# Altium footprint library Miscellaneous SMD.PcbLib: 82 footprints (part 5 of 7) (continued)
## MINI-DIMM_DDR3-1.5V (MO-244) [mm] "Mini DIMM 244 Contacts (DDR3 1.5V Mechanical Keying) Board Edge Connector (JEDEC MO-244)" (continued)
Top Overlay:
  text "122" at 39.175,-0.825 h0.76
  text "1" at -38.55,-0.675 h0.76
Bottom Overlay:
  text "244" at 38.475,-0.925 h0.76
  text "123" at -39.3,-0.875 h0.76
Mechanical 8:
  circle w0.1: c39,4.475 r0.9
  circle w0.1: c-39,4.475 r0.9
  lines w0.1: -46,-1.525 -41,-1.525 -41,-6.525 ; -41.5,18.475 -41,18.475 ; -41,17.975 -41,18.475 ; -41,18.975 -41,18.475 ; -41,30.845 -41,20.475 cw(c-41,18.475) -41,16.475 -41,9.475 -40,9.475 cw(c-40,8.475) -40,7.475 -41,7.475 -41,-0.775 -40.25,-1.525 2.4,-1.525 2.4,1.775 ; -40.5,8.475 -40,8.475 ; -40.5,18.475 -41,18.475 ; -40,7.975 -40,8.475 ; -40,8.975 -40,8.475 ; -39.5,4.475 -39,4.475 ; -39.5,8.475 -40,8.475 ; -39,3.975 -39,4.475 ; -39,4.975 -39,4.475 ; -39,30.845 -39,20.711 cw(c-41,18.475) -38,18.475 -38,2.475 38,2.475 38,18.475 cw(c41,18.475) 39,20.711 39,30.845 ; -38.5,4.475 -39,4.475 ; -0.5,7.365 0,7.365 ; -0.354,-0.354 0,0 ; -0.354,0.354 0,0 ; -0.25,3.525 3.825,3.525 ; 0,6.865 0,7.365 ; 0,7.865 0,7.365 ; 0.35,3.275 0.6,3.525 0.35,3.775 ; 0.354,-0.354 0,0 ; 0.354,0.354 0,0 ; 0.5,7.365 0,7.365 ; 0.6,4 0.6,0 ; 2.9,1.275 2.9,1.775 ; 2.9,2.275 2.9,1.775 ; 2.9,4 2.9,1.775 ; 3.15,3.275 2.9,3.525 3.15,3.775 ; 38.5,4.475 39,4.475 ; 39,3.975 39,4.475 ; 39,4.975 39,4.475 ; 39.5,4.475 39,4.475 ; 39.5,8.475 40,8.475 ; 40,7.975 40,8.475 ; 40,8.975 40,8.475 ; 40.5,8.475 40,8.475 ; 40.5,18.475 41,18.475 ; 41,-6.525 41,-1.525 46,-1.525 ; 41,17.975 41,18.475 ; 41,18.975 41,18.475 ; 41,30.845 41,20.475 ccw(c41,18.475) 41,16.475 41,9.475 40,9.475 ccw(c40,8.475) 40,7.475 41,7.475 41,-0.775 40.25,-1.525 3.4,-1.525 3.4,1.775 ; 41.5,18.475 41,18.475 ; -38.025,1.275 -37.8,0 -37.575,1.275 ; -38.025,1.275 -37.575,1.275 ; -38.025,1.275 -38.025,-1.275 -37.575,-1.275 -37.575,1.275 ; 0.375,1.275 0.6,0 ; 0.375,1.275 0.825,1.275 ; 0.375,1.275 0.375,-1.275 0.825,-1.275 0.825,1.275 ; 0.6,0 0.825,1.275 ; 2.4,1.775 cw(c2.9,1.775) 3.4,1.775 ; 2.4,1.775 2.9,1.775 ; 2.9,1.775 3.4,1.775 ; 3.975,1.275 4.2,0 4.425,1.275 ; 3.975,1.275 4.425,1.275 ; 3.975,1.275 3.975,-1.275 4.425,-1.275 4.425,1.275 ; 37.575,1.275 37.8,0 38.025,1.275 ; 37.575,1.275 38.025,1.275 ; 37.575,1.275 37.575,-1.275 38.025,-1.275 38.025,1.275
  text "2.3mm" at -0.425,4.45 h1.2

## MITSUBISHI_FU-456RDF-9M2-A [mm] "1.3um Band Transmitter Optical Sub Assembly  (TOSA) Laser Module"
height 14.53
pads (8):
  round 1.1 hole 0.6: 1(-1.7,2.75) 8(-1.7,-2.75)
  rect 1.05x0.45 smd: 2(0,1.975) 3(0,1.185) 4(0,0.395) 5(0,-0.395) 6(0,-1.185) 7(0,-1.975)
Top Overlay:
  circle w0.2: c-13.75,0.2 r2.4
  circle w0.2: c-13.75,0.2 r1
  circle w0.2: c-13.75,0.2 r1.495
  lines w0.2: -12.915,-2.05 -5.45,-2.05 -4.05,-2.75 -2.6,-2.75 ; -12.915,2.45 -4.65,2.45 -4.05,2.75 -2.6,2.75 ; -0.8,-2.75 0.65,-2.75 0.65,-2.605 ; -0.8,2.75 0.65,2.75 0.65,2.605
  text "1" at -3.088,1.25 h1
Mechanical 8:
  lines w0.1: -14,0.2 -13.75,0.2 ; -13.75,-0.05 -13.75,0.2 ; -13.75,0.45 -13.75,0.2 ; -13.5,0.2 -13.75,0.2 ; -1.95,-2.75 -1.7,-2.75 ; -1.95,2.75 -1.7,2.75 ; -1.7,-3 -1.7,-2.75 ; -1.7,-2.5 -1.7,-2.75 ; -1.7,2.5 -1.7,2.75 ; -1.7,3 -1.7,2.75 ; -1.45,-2.75 -1.7,-2.75 ; -1.45,2.75 -1.7,2.75 ; -0.354,-0.354 0,0 ; -0.354,0.354 0,0 ; -0.25,-1.975 0,-1.975 ; -0.25,-1.185 0,-1.185 ; -0.25,-0.395 0,-0.395 ; -0.25,0.395 0,0.395 ; -0.25,1.185 0,1.185 ; -0.25,1.975 0,1.975 ; 0,-2.225 0,-1.975 ; 0,-1.725 0,-1.975 ; 0,-1.435 0,-1.185 ; 0,-0.935 0,-1.185 ; 0,-0.645 0,-0.395 ; 0,-0.145 0,-0.395 ; 0,0.145 0,0.395 ; 0,0.645 0,0.395 ; 0,0.935 0,1.185 ; 0,1.435 0,1.185 ; 0,1.725 0,1.975 ; 0,2.225 0,1.975 ; 0.25,-1.975 0,-1.975 ; 0.25,-1.185 0,-1.185 ; 0.25,-0.395 0,-0.395 ; 0.25,0.395 0,0.395 ; 0.25,1.185 0,1.185 ; 0.25,1.975 0,1.975 ; 0.354,-0.354 0,0 ; 0.354,0.354 0,0
Mechanical 14:
  circle w0.1: c-13.75,0.2 r2.4
  circle w0.1: c-13.75,0.2 r1
  circle w0.1: c-13.75,0.2 r1.495
  lines w0.1: -12.915,-2.05 -5.45,-2.05 -4.05,-2.75 -2,-2.75 cw(c-1.7,-2.75) -1.4,-2.75 0.65,-2.75 0.65,2.75 -1.4,2.75 cw(c-1.7,2.75) -2,2.75 -4.05,2.75 -4.65,2.45 -12.915,2.45 ; -2.2,-2.75 cw(c-1.7,-2.75) -1.2,-2.75 ; -2.2,2.75 ccw(c-1.7,2.75) -1.2,2.75 ; -0.5,-2.175 0.5,-2.175 0.5,-1.775 -0.5,-1.775 -0.5,-2.175 ; -0.5,-1.385 0.5,-1.385 0.5,-0.985 -0.5,-0.985 -0.5,-1.385 ; -0.5,-0.595 0.5,-0.595 0.5,-0.195 -0.5,-0.195 -0.5,-0.595 ; -0.5,0.195 0.5,0.195 0.5,0.595 -0.5,0.595 -0.5,0.195 ; -0.5,0.985 0.5,0.985 0.5,1.385 -0.5,1.385 -0.5,0.985 ; -0.5,1.775 0.5,1.775 0.5,2.175 -0.5,2.175 -0.5,1.775
  text "1" at -3.088,1.25 h1
3D body "MITSUBISHI_FU-456RDF-9M2-A.stp": height 13.97, standoff -1.07, extent -16.15,-2.75 0.65,2.75

## MULTICOMP_64L020S-3x1N-B [mm] "0.6mm Pitch, Mini DisplayPort Receptacle, 20 Positions, Right Angled"
height 8.2
pads (24):
  rect 0.45x1.4 smd: 1(2.7,6.67) 3(2.1,6.67) 5(1.5,6.67) 7(0.9,6.67) 9(0.3,6.67) 11(-0.3,6.67) 13(-0.9,6.67) 15(-1.5,6.67) 17(-2.1,6.67) 19(-2.7,6.67)
  round 0.9 hole 0.5: 2(2.7,3.5) 4(2.7,4.71) 6(1.52,4.71) 8(1.6,3.5) 10(0.53,3.5) 12(-0.53,3.5) 14(-1.6,3.5) 16(-1.52,4.71) 18(-2.7,4.71)
  round 1.1 hole 0.6: 20(-2.8,3.5)
  round 0.5 hole 1.5 unplated mask+0.5: P1(-2.4,0) P2(2.4,0)
  oval 1.5x2.9 hole 0.8 slot 2.1 at 90 deg: SHIELD(-4.35,1.93) SHIELD(4.35,1.93)
Top Overlay:
  circle w0.25: c3.5,7.5 r0.125
  lines w0.2: -4.557,0 -4.557,-1.11 -4.15,-1.11 ; -4.557,3.81 -4.557,6.552 -3.425,6.552 ; -4.557,5.63 -4.536,5.63 ; -4.29,-1.11 -4.29,0 ; -4.15,0 -4.15,-7.4 4.15,-7.4 4.15,0 ; -4.15,3.81 -4.15,5.63 -3.425,5.63 ; -4.15,4.252 -4.536,4.252 -4.536,5.752 cw(c-3.736,5.752) -3.736,6.552 ; -4.129,5.63 -4.129,5.752 cw(c-3.729,5.752) -3.729,6.152 -3.425,6.152 ; -3.4,-7.4 -3.4,-0.75 ; -0.946,-6.234 -1.113,-3.392 ccw(c-1.5,-3.446) -1.888,-3.394 -2.058,-6.234 cw(c-2.267,-6.151) -2.492,-6.137 -2.293,-2.984 cw(c-1.794,-3.016) -1.794,-2.516 -1.206,-2.516 cw(c-1.206,-3.016) -0.707,-2.984 -0.508,-6.137 cw(c-0.733,-6.151) -0.942,-6.234 ; 0.942,-6.234 cw(c0.733,-6.151) 0.508,-6.137 0.707,-2.984 cw(c1.206,-3.016) 1.206,-2.516 1.794,-2.516 cw(c1.794,-3.016) 2.293,-2.984 2.492,-6.137 cw(c2.267,-6.151) 2.058,-6.234 1.888,-3.394 ccw(c1.5,-3.446) 1.113,-3.392 0.946,-6.234 ; 3.4,-7.4 3.4,-0.75 ; 3.425,5.63 4.15,5.63 4.15,3.81 ; 3.425,6.152 3.729,6.152 cw(c3.729,5.752) 4.129,5.752 4.129,5.63 ; 3.425,6.552 4.557,6.552 4.557,3.81 ; 3.736,6.552 cw(c3.736,5.752) 4.536,5.752 4.536,4.252 4.15,4.252 ; 4.15,-1.11 4.557,-1.11 4.557,0 ; 4.536,5.63 4.557,5.63
Mechanical 8:
  drawing of 167 lines, arcs and shapes, not listed
  text "8" at 1.513,2.486 h0.25
  text "20" at -2.972,2.486 h0.25
  text "16" at -0.762,4.572 h0.25
  text "14" at -1.763,2.486 h0.25
  text "12" at -0.688,2.486 h0.25
  text "10" at 0.38,2.486 h0.25
  text "6" at 0.635,4.572 h0.25
  text "2" at 2.608,2.486 h0.25
  text "4" at 3.4,4.572 h0.25
  text "18" at -3.81,4.572 h0.25
  text "19" at -2.859,5.581 h0.25
  text "17" at -2.25,5.581 h0.25
  text "15" at -1.655,5.581 h0.25
  text "13" at -1.055,5.581 h0.25
  text "11" at -0.425,5.581 h0.25
  text "9" at 0.208,5.581 h0.25
  text "7" at 0.813,5.581 h0.25
  text "5" at 1.407,5.581 h0.25
  text "3" at 2.007,5.581 h0.25
  text "1" at 2.638,5.581 h0.25
Mechanical 14:
  circle w0.25: c3.5,7.5 r0.125
  lines w0.1: -4.557,5.63 -4.536,5.63 ; -4.536,4.252 -4.15,4.252 ; -4.29,-1.11 -4.29,3.452 ; -4.15,-1.11 -4.557,-1.11 -4.557,6.552 4.557,6.552 4.557,-1.11 4.15,-1.11 ; -4.15,3.452 -4.536,3.452 -4.536,5.752 cw(c-3.736,5.752) -3.736,6.552 ; -4.129,5.63 -4.129,5.752 cw(c-3.729,5.752) -3.729,6.152 -3.4,6.152 ; -3.4,-7.4 -3.4,6.552 ; -3.4,5.63 -4.15,5.63 -4.15,-7.4 4.15,-7.4 4.15,5.63 3.4,5.63 ; -2.8,6.552 -2.8,6.96 -2.6,6.96 -2.6,6.552 ; -2.2,6.552 -2.2,6.96 -2,6.96 -2,6.552 ; -1.6,6.552 -1.6,6.96 -1.4,6.96 -1.4,6.552 ; -1,6.552 -1,6.96 -0.8,6.96 -0.8,6.552 ; -0.946,-6.234 -1.113,-3.392 ccw(c-1.5,-3.446) -1.888,-3.394 -2.058,-6.234 cw(c-2.267,-6.151) -2.492,-6.137 -2.293,-2.984 cw(c-1.794,-3.016) -1.794,-2.516 -1.206,-2.516 cw(c-1.206,-3.016) -0.707,-2.984 -0.508,-6.137 cw(c-0.733,-6.151) -0.942,-6.234 ; -0.4,6.552 -0.4,6.96 -0.2,6.96 -0.2,6.552 ; 0.2,6.552 0.2,6.96 0.4,6.96 0.4,6.552 ; 0.8,6.552 0.8,6.96 1,6.96 1,6.552 ; 0.942,-6.234 cw(c0.733,-6.151) 0.508,-6.137 0.707,-2.984 cw(c1.206,-3.016) 1.206,-2.516 1.794,-2.516 cw(c1.794,-3.016) 2.293,-2.984 2.492,-6.137 cw(c2.267,-6.151) 2.058,-6.234 1.888,-3.394 ccw(c1.5,-3.446) 1.113,-3.392 0.946,-6.234 ; 1.4,6.552 1.4,6.96 1.6,6.96 1.6,6.552 ; 2,6.552 2,6.96 2.2,6.96 2.2,6.552 ; 2.6,6.552 2.6,6.96 2.8,6.96 2.8,6.552 ; 3.4,-7.4 3.4,6.552 ; 3.4,6.152 3.729,6.152 cw(c3.729,5.752) 4.129,5.752 4.129,5.63 ; 3.736,6.552 cw(c3.736,5.752) 4.536,5.752 4.536,3.452 4.15,3.452 ; 4.15,4.252 4.536,4.252 ; 4.29,-1.11 4.29,3.452 ; 4.536,5.63 4.557,5.63
Mechanical 15:
  lines w0.05: -4.807,-7.65 -4.807,7.21 4.807,7.21 4.807,-7.65 -4.807,-7.65
3D body "MULTICOMP_64L020S-3x1N-B.stp": height 8.38, standoff -2.3, extent -4.55,-7.4 4.557,7.16

## NICOMATIC_C12000B [mm] "Surface Mount PCB Test Point"
height 1.5
pads (2):
  rect 1.5x1.5 smd: 1(-1,0) 1(1,0)
Top Overlay:
  lines w0.2: -0.7,-1.05 0.7,-1.05 ; -0.7,1.05 0.7,1.05
Mechanical 8:
  lines w0.1: -0.6,0 0,0 ; 0,-0.6 0,0 ; 0,0.6 0,0 ; 0.6,0 0,0
Mechanical 14:
  lines w0.1: -1.25,-0.675 -0.35,-0.675 -0.35,-0.475 0.35,-0.475 0.35,-0.675 1.25,-0.675 1.25,0.675 0.35,0.675 0.35,0.475 -0.35,0.475 -0.35,0.675 -1.25,0.675 -1.25,-0.675
Mechanical 15:
  lines w0.05: -2,-1.3 2,-1.3 2,1.3 -2,1.3 -2,-1.3
3D body "NICOMATIC_C12000B.stp": height 1.5, standoff 0, extent -1.25,-0.675 1.25,0.675

## PANASONIC_AXE720127 [mm] "20 Contacts, Pitch 0.35mm, Surface Mount, Straight FPC Socket, A35S Series"
height 0.77
pads (32):
  rect 0.2x0.5 smd: 1(-1.575,-1.2) 2(-1.575,1.2) 3(-1.225,-1.2) 4(-1.225,1.2) 5(-0.875,-1.2) 6(-0.875,1.2) 7(-0.525,-1.2) 8(-0.525,1.2) 9(-0.175,-1.2) 10(-0.175,1.2) 11(0.175,-1.2) 12(0.175,1.2) 13(0.525,-1.2) 14(0.525,1.2) 15(0.875,-1.2) 16(0.875,1.2) 17(1.225,-1.2) 18(1.225,1.2) 19(1.575,-1.2) 20(1.575,1.2)
  rect 0.15x0.15 smd: 21(-2.7,1.225) 22(-2.7,-1.24) 23(2.7,-1.24) 24(2.7,1.24)
  rect 0.9x0.35 smd: 21(-2.475,0.975) 22(-2.475,-0.99) 23(2.475,-0.99) 24(2.475,0.99)
  rect 0.6x0.3 smd: 21(-2.325,1.3) 22(-2.325,-1.315) 23(2.325,-1.315) 24(2.325,1.315)
Top Layer:
  region: 2.925,-0.53 2.925,-1.15 2.625,-1.45 2.025,-1.45 2.025,-0.53
  region: 2.015,1.44 2.635,1.44 2.935,1.14 2.935,0.54 2.015,0.54
  region: -2.015,-1.44 -2.635,-1.44 -2.935,-1.14 -2.935,-0.54 -2.015,-0.54
  region: -2.925,0.53 -2.925,1.15 -2.625,1.45 -2.025,1.45 -2.025,0.53
Top Layer keep-out:
  region: -1.675,-0.8 1.675,-0.8 1.675,0.8 -1.675,0.8
Top Overlay:
  circle w0.25: c-1.575,-2.2 r0.125
  lines w0.2: -2.925,-0.18 -2.925,0.18 ; -2.475,-0.18 -2.475,0.18 ; 2.475,-0.18 2.475,0.18 ; 2.925,-0.18 2.925,0.18
Mechanical 8:
  drawing of 184 lines, arcs and shapes, not listed
Mechanical 14:
  drawing of 192 lines, arcs and shapes, not listed
Mechanical 15:
  lines w0.05: -3.175,-1.7 -3.175,1.7 3.175,1.7 3.175,-1.7 -3.175,-1.7
3D body "PANASONIC_AXE720127.stp": height 0.77, standoff 0, extent -2.925,-1.25 2.925,1.25

## PANASONIC_AXE820124 [mm] "20 Contacts, Pitch 0.35mm, Surface Mount, Straight FPC Header, A35S Series"
height 0.65
pads (24):
  rect 0.2x0.65 smd: 1(1.575,-0.875) 2(1.575,0.875) 3(1.225,-0.875) 4(1.225,0.875) 5(0.875,-0.875) 6(0.875,0.875) 7(0.525,-0.875) 8(0.525,0.875) 9(0.175,-0.875) 10(0.175,0.875) 11(-0.175,-0.875) 12(-0.175,0.875) 13(-0.525,-0.875) 14(-0.525,0.875) 15(-0.875,-0.875) 16(-0.875,0.875) 17(-1.225,-0.875) 18(-1.225,0.875) 19(-1.575,-0.875) 20(-1.575,0.875)
  rect 0.45x0.53 smd: 21(-2.275,0.565) 22(-2.275,-0.565) 23(2.275,-0.565) 24(2.275,0.565)
Top Overlay:
  circle w0.25: c1.575,-1.9 r0.125
Mechanical 8:
  drawing of 178 lines, arcs and shapes, not listed
Mechanical 14:
  drawing of 228 lines, arcs and shapes, not listed
Mechanical 15:
  lines w0.05: -2.825,-1.08 -2.825,1.08 -1.925,1.08 -1.925,1.45 1.925,1.45 1.925,1.08 2.825,1.08 2.825,-1.08 1.925,-1.08 1.925,-1.45 -1.925,-1.45 -1.925,-1.08 -2.825,-1.08
3D body "PANASONIC_AXE820124.stp": height 0.65, standoff 0, extent -2.575,-1 2.575,1

## PANASONIC_AXK5S00247YG [mm] "100 Contacts, Narrow-Pitch 0.5mm, Surface Mount, Straight Board Stacking Socket, AXK5S Serie"
height 3.55
pads (100):
  rect 0.75x2 smd: 1(12.5,-2.2) 2(12.5,2.2) 99(-12.5,-2.2) 100(-12.5,2.2)
  rect 0.25x2 smd: 3(11.75,-2.2) 4(11.75,2.2) 5(11.25,-2.2) 6(11.25,2.2) 7(10.75,-2.2) 8(10.75,2.2) 9(10.25,-2.2) 10(10.25,2.2) 11(9.75,-2.2) 12(9.75,2.2) 13(9.25,-2.2) 14(9.25,2.2) 15(8.75,-2.2) 16(8.75,2.2) 17(8.25,-2.2) 18(8.25,2.2) 19(7.75,-2.2) 20(7.75,2.2) 21(7.25,-2.2) 22(7.25,2.2) 23(6.75,-2.2) 24(6.75,2.2) 25(6.25,-2.2) 26(6.25,2.2) 27(5.75,-2.2) 28(5.75,2.2) 29(5.25,-2.2) 30(5.25,2.2) 31(4.75,-2.2) 32(4.75,2.2) 33(4.25,-2.2) 34(4.25,2.2) 35(3.75,-2.2) 36(3.75,2.2) 37(3.25,-2.2) 38(3.25,2.2) 39(2.75,-2.2) 40(2.75,2.2) 41(2.25,-2.2) 42(2.25,2.2) 43(1.75,-2.2) 44(1.75,2.2) 45(1.25,-2.2) 46(1.25,2.2) 47(0.75,-2.2) 48(0.75,2.2) 49(0.25,-2.2) 50(0.25,2.2) 51(-0.25,-2.2) 52(-0.25,2.2) 53(-0.75,-2.2) 54(-0.75,2.2) 55(-1.25,-2.2) 56(-1.25,2.2) 57(-1.75,-2.2) 58(-1.75,2.2) 59(-2.25,-2.2) 60(-2.25,2.2) 61(-2.75,-2.2) 62(-2.75,2.2) 63(-3.25,-2.2) 64(-3.25,2.2) 65(-3.75,-2.2) 66(-3.75,2.2) 67(-4.25,-2.2) 68(-4.25,2.2) 69(-4.75,-2.2) 70(-4.75,2.2) 71(-5.25,-2.2) 72(-5.25,2.2) 73(-5.75,-2.2) 74(-5.75,2.2) 75(-6.25,-2.2) 76(-6.25,2.2) 77(-6.75,-2.2) 78(-6.75,2.2) 79(-7.25,-2.2) 80(-7.25,2.2) 81(-7.75,-2.2) 82(-7.75,2.2) 83(-8.25,-2.2) 84(-8.25,2.2) 85(-8.75,-2.2) 86(-8.75,2.2) 87(-9.25,-2.2) 88(-9.25,2.2) 89(-9.75,-2.2) 90(-9.75,2.2) 91(-10.25,-2.2) 92(-10.25,2.2) 93(-10.75,-2.2) 94(-10.75,2.2) 95(-11.25,-2.2) 96(-11.25,2.2) 97(-11.75,-2.2) 98(-11.75,2.2)
Top Overlay:
  circle w0.25: c13.725,-3 r0.125
  lines w0.2: -13.225,-2.275 -14.1,-1.4 -14.1,2.3 -13.225,2.3 ; -13.225,1.02 -13.4,1.02 ; -13.225,1.28 -13.66,1.28 ; -12.97,-0.85 -13.4,-0.42 ; 12.97,-0.85 13.4,-0.42 ; 13.225,-2.275 14.1,-1.4 14.1,-0.6 14,-0.6 14,0.6 14.1,0.6 14.1,2.3 13.225,2.3 ; 13.225,1.02 13.4,1.02 ; 13.225,1.28 13.66,1.28 ; -13.66,1.28 -13.4,1.02 ; -13.66,1.28 -13.66,-0.42 -13.4,-0.42 ; -13.4,-0.42 -13.4,1.02 ; 13.4,-0.42 13.66,-0.42 13.66,1.28 ; 13.4,-0.42 13.4,1.02 ; 13.4,1.02 13.66,1.28
Mechanical 8:
  drawing of 604 lines, arcs and shapes, not listed
Mechanical 14:
  lines w0.1: -13.66,1.28 -13.4,1.02 ; -13.66,1.28 13.66,1.28 ; -13.66,1.28 -13.66,-0.42 -13.4,-0.42 ; -13.4,-0.42 -13.4,1.02 ; -13.4,-0.42 -12.8,-1.02 ; -13.4,1.02 -12.45,1.02 -12.45,1.08 12.45,1.08 12.45,1.02 13.4,1.02 ; -12.8,-1.02 -12.8,-1.28 12.8,-1.28 12.8,-1.02 ; -12.8,-1.02 -12.45,-1.02 -12.45,-1.08 12.45,-1.08 12.45,-1.02 12.8,-1.02 ; 12.8,-1.02 13.4,-0.42 ; 13.4,-0.42 13.66,-0.42 13.66,1.28 ; 13.4,-0.42 13.4,1.02 ; 13.4,1.02 13.66,1.28 ; -14.1,-1.4 -14.1,2.3 14.1,2.3 14.1,0.6 14,0.6 14,-0.6 14.1,-0.6 14.1,-1.4 13.2,-2.3 -13.2,-2.3 -14.1,-1.4
Mechanical 15:
  lines w0.05: -14.35,-3.45 -14.35,3.45 14.35,3.45 14.35,-3.45 -14.35,-3.45
3D body "PANASONIC_AXK5S00247YG.stp": height 3.55, standoff 0, extent -14.1,-2.7 14.1,2.7

## PANASONIC_AXK5SA3277YG [mm] "130 Contacts, Narrow-Pitch 0.5mm, Surface Mount, Straight Board Stacking Socket, AXK5S Serie"
height 3.55
pads (132):
  rect 0.5x2 smd: 1(16.125,-2.2) 2(16.125,2.2) 129(-16.125,-2.2) 130(-16.125,2.2)
  rect 0.25x2 smd: 3(15.5,-2.2) 4(15.5,2.2) 5(15,-2.2) 6(15,2.2) 7(14.5,-2.2) 8(14.5,2.2) 9(14,-2.2) 10(14,2.2) 11(13.5,-2.2) 12(13.5,2.2) 13(13,-2.2) 14(13,2.2) 15(12.5,-2.2) 16(12.5,2.2) 17(12,-2.2) 18(12,2.2) 19(11.5,-2.2) 20(11.5,2.2) 21(11,-2.2) 22(11,2.2) 23(10.5,-2.2) 24(10.5,2.2) 25(10,-2.2) 26(10,2.2) 27(9.5,-2.2) 28(9.5,2.2) 29(9,-2.2) 30(9,2.2) 31(8.5,-2.2) 32(8.5,2.2) 33(8,-2.2) 34(8,2.2) 35(7.5,-2.2) 36(7.5,2.2) 37(7,-2.2) 38(7,2.2) 39(6.5,-2.2) 40(6.5,2.2) 41(6,-2.2) 42(6,2.2) 43(5.5,-2.2) 44(5.5,2.2) 45(5,-2.2) 46(5,2.2) 47(4.5,-2.2) 48(4.5,2.2) 49(4,-2.2) 50(4,2.2) 51(3.5,-2.2) 52(3.5,2.2) 53(3,-2.2) 54(3,2.2) 55(2.5,-2.2) 56(2.5,2.2) 57(2,-2.2) 58(2,2.2) 59(1.5,-2.2) 60(1.5,2.2) 61(1,-2.2) 62(1,2.2) 63(0.5,-2.2) 64(0.5,2.2) 65(0,-2.2) 66(0,2.2) 67(-0.5,-2.2) 68(-0.5,2.2) 69(-1,-2.2) 70(-1,2.2) 71(-1.5,-2.2) 72(-1.5,2.2) 73(-2,-2.2) 74(-2,2.2) 75(-2.5,-2.2) 76(-2.5,2.2) 77(-3,-2.2) 78(-3,2.2) 79(-3.5,-2.2) 80(-3.5,2.2) 81(-4,-2.2) 82(-4,2.2) 83(-4.5,-2.2) 84(-4.5,2.2) 85(-5,-2.2) 86(-5,2.2) 87(-5.5,-2.2) 88(-5.5,2.2) 89(-6,-2.2) 90(-6,2.2) 91(-6.5,-2.2) 92(-6.5,2.2) 93(-7,-2.2) 94(-7,2.2) 95(-7.5,-2.2) 96(-7.5,2.2) 97(-8,-2.2) 98(-8,2.2) 99(-8.5,-2.2) 100(-8.5,2.2) 101(-9,-2.2) 102(-9,2.2) 103(-9.5,-2.2) 104(-9.5,2.2) 105(-10,-2.2) 106(-10,2.2) 107(-10.5,-2.2) 108(-10.5,2.2) 109(-11,-2.2) 110(-11,2.2) 111(-11.5,-2.2) 112(-11.5,2.2) 113(-12,-2.2) 114(-12,2.2) 115(-12.5,-2.2) 116(-12.5,2.2) 117(-13,-2.2) 118(-13,2.2) 119(-13.5,-2.2) 120(-13.5,2.2) 121(-14,-2.2) 122(-14,2.2) 123(-14.5,-2.2) 124(-14.5,2.2) 125(-15,-2.2) 126(-15,2.2) 127(-15.5,-2.2) 128(-15.5,2.2)
  round 0.5 hole 0.65 unplated mask+0.075: 131(-17.25,1.5) 132(17.25,-1.5)
Top Overlay:
  circle w0.25: c17.125,-3 r0.125
  lines w0.2: -17.5,0.927 -17.5,0.6 -17.4,0.6 -17.4,-0.6 -17.5,-0.6 -17.5,-2.3 -16.675,-2.3 ; -17.5,2.073 -17.5,2.3 -16.675,2.3 ; -17.015,0.921 -17.015,-1.28 ; -16.801,1.066 -16.755,1.02 ; -16.675,-1.28 -17.015,-1.28 ; -16.675,-1.02 -16.755,-1.02 ; -16.675,1.02 -16.755,1.02 ; 16.675,-2.3 17.5,-2.3 17.5,-2.073 ; 16.675,-1.02 16.755,-1.02 ; 16.675,1.02 16.755,1.02 ; 16.675,1.28 17.015,1.28 ; 16.675,2.3 17.5,2.3 17.5,0.6 17.4,0.6 17.4,-0.6 17.5,-0.6 17.5,-0.927 ; 16.801,-1.066 16.755,-1.02 ; 17.015,-0.921 17.015,1.28 ; -17.015,-1.28 -16.755,-1.02 ; -16.755,-1.02 -16.755,1.02 ; 16.755,-1.02 16.755,1.02 ; 16.755,1.02 17.015,1.28
Mechanical 8:
  drawing of 792 lines, arcs and shapes, not listed
Mechanical 14:
  drawing of 428 lines, arcs and shapes, not listed
Mechanical 15:
  lines w0.05: -17.75,-3.45 17.75,-3.45 17.75,3.45 -17.75,3.45 -17.75,-3.45
3D body "PANASONIC_AXK5SA3277YG.stp": height 3.55, standoff -0.45, extent -17.5,-2.7 17.5,2.7

## PANASONIC_AXK5SA3277YG_A [mm] "130 Contacts, Narrow-Pitch 0.5mm, Surface Mount, Straight Board Stacking Socket, AXK5S Serie"
height 3.55
pads (132):
  rect 0.5x2 smd: 1(16.125,2.2) 2(16.125,-2.2) 129(-16.125,2.2) 130(-16.125,-2.2)
  rect 0.25x2 smd: 3(15.5,2.2) 4(15.5,-2.2) 5(15,2.2) 6(15,-2.2) 7(14.5,2.2) 8(14.5,-2.2) 9(14,2.2) 10(14,-2.2) 11(13.5,2.2) 12(13.5,-2.2) 13(13,2.2) 14(13,-2.2) 15(12.5,2.2) 16(12.5,-2.2) 17(12,2.2) 18(12,-2.2) 19(11.5,2.2) 20(11.5,-2.2) 21(11,2.2) 22(11,-2.2) 23(10.5,2.2) 24(10.5,-2.2) 25(10,2.2) 26(10,-2.2) 27(9.5,2.2) 28(9.5,-2.2) 29(9,2.2) 30(9,-2.2) 31(8.5,2.2) 32(8.5,-2.2) 33(8,2.2) 34(8,-2.2) 35(7.5,2.2) 36(7.5,-2.2) 37(7,2.2) 38(7,-2.2) 39(6.5,2.2) 40(6.5,-2.2) 41(6,2.2) 42(6,-2.2) 43(5.5,2.2) 44(5.5,-2.2) 45(5,2.2) 46(5,-2.2) 47(4.5,2.2) 48(4.5,-2.2) 49(4,2.2) 50(4,-2.2) 51(3.5,2.2) 52(3.5,-2.2) 53(3,2.2) 54(3,-2.2) 55(2.5,2.2) 56(2.5,-2.2) 57(2,2.2) 58(2,-2.2) 59(1.5,2.2) 60(1.5,-2.2) 61(1,2.2) 62(1,-2.2) 63(0.5,2.2) 64(0.5,-2.2) 65(0,2.2) 66(0,-2.2) 67(-0.5,2.2) 68(-0.5,-2.2) 69(-1,2.2) 70(-1,-2.2) 71(-1.5,2.2) 72(-1.5,-2.2) 73(-2,2.2) 74(-2,-2.2) 75(-2.5,2.2) 76(-2.5,-2.2) 77(-3,2.2) 78(-3,-2.2) 79(-3.5,2.2) 80(-3.5,-2.2) 81(-4,2.2) 82(-4,-2.2) 83(-4.5,2.2) 84(-4.5,-2.2) 85(-5,2.2) 86(-5,-2.2) 87(-5.5,2.2) 88(-5.5,-2.2) 89(-6,2.2) 90(-6,-2.2) 91(-6.5,2.2) 92(-6.5,-2.2) 93(-7,2.2) 94(-7,-2.2) 95(-7.5,2.2) 96(-7.5,-2.2) 97(-8,2.2) 98(-8,-2.2) 99(-8.5,2.2) 100(-8.5,-2.2) 101(-9,2.2) 102(-9,-2.2) 103(-9.5,2.2) 104(-9.5,-2.2) 105(-10,2.2) 106(-10,-2.2) 107(-10.5,2.2) 108(-10.5,-2.2) 109(-11,2.2) 110(-11,-2.2) 111(-11.5,2.2) 112(-11.5,-2.2) 113(-12,2.2) 114(-12,-2.2) 115(-12.5,2.2) 116(-12.5,-2.2) 117(-13,2.2) 118(-13,-2.2) 119(-13.5,2.2) 120(-13.5,-2.2) 121(-14,2.2) 122(-14,-2.2) 123(-14.5,2.2) 124(-14.5,-2.2) 125(-15,2.2) 126(-15,-2.2) 127(-15.5,2.2) 128(-15.5,-2.2)
  round 0.5 hole 0.65 unplated mask+0.075: 131(-17.25,1.5) 132(17.25,-1.5)
Top Overlay:
  circle w0.25: c17.175,3 r0.125
  lines w0.2: -17.5,0.927 -17.5,0.6 -17.4,0.6 -17.4,-0.6 -17.5,-0.6 -17.5,-2.3 -16.675,-2.3 ; -17.5,2.073 -17.5,2.3 -16.675,2.3 ; -17.015,0.921 -17.015,-1.28 ; -16.801,1.066 -16.755,1.02 ; -16.675,-1.28 -17.015,-1.28 ; -16.675,-1.02 -16.755,-1.02 ; -16.675,1.02 -16.755,1.02 ; 16.675,-2.3 17.5,-2.3 17.5,-2.073 ; 16.675,-1.02 16.755,-1.02 ; 16.675,1.02 16.755,1.02 ; 16.675,1.28 17.015,1.28 ; 16.675,2.3 17.5,2.3 17.5,0.6 17.4,0.6 17.4,-0.6 17.5,-0.6 17.5,-0.927 ; 16.801,-1.066 16.755,-1.02 ; 17.015,-0.921 17.015,1.28 ; -17.015,-1.28 -16.755,-1.02 ; -16.755,-1.02 -16.755,1.02 ; 16.755,-1.02 16.755,1.02 ; 16.755,1.02 17.015,1.28
Mechanical 8:
  drawing of 792 lines, arcs and shapes, not listed
Mechanical 14:
  drawing of 428 lines, arcs and shapes, not listed
Mechanical 15:
  lines w0.05: -17.75,-3.45 -17.75,3.45 17.75,3.45 17.75,-3.45 -17.75,-3.45
3D body "PANASONIC_AXK5SA3277YG.stp": height 3.55, standoff -0.45, extent -17.5,-2.7 17.5,2.7

## PANASONIC_AXK6S00647YG [mm] "100 Contacts, Narrow-Pitch 0.5mm, Surface Mount, Straight Board Stacking Header, PK5, PK5S Series"
height 5.3
pads (100):
  rect 0.75x2 smd: 1(-12.5,-2) 2(-12.5,2) 99(12.5,-2) 100(12.5,2)
  rect 0.25x2 smd: 3(-11.75,-2) 4(-11.75,2) 5(-11.25,-2) 6(-11.25,2) 7(-10.75,-2) 8(-10.75,2) 9(-10.25,-2) 10(-10.25,2) 11(-9.75,-2) 12(-9.75,2) 13(-9.25,-2) 14(-9.25,2) 15(-8.75,-2) 16(-8.75,2) 17(-8.25,-2) 18(-8.25,2) 19(-7.75,-2) 20(-7.75,2) 21(-7.25,-2) 22(-7.25,2) 23(-6.75,-2) 24(-6.75,2) 25(-6.25,-2) 26(-6.25,2) 27(-5.75,-2) 28(-5.75,2) 29(-5.25,-2) 30(-5.25,2) 31(-4.75,-2) 32(-4.75,2) 33(-4.25,-2) 34(-4.25,2) 35(-3.75,-2) 36(-3.75,2) 37(-3.25,-2) 38(-3.25,2) 39(-2.75,-2) 40(-2.75,2) 41(-2.25,-2) 42(-2.25,2) 43(-1.75,-2) 44(-1.75,2) 45(-1.25,-2) 46(-1.25,2) 47(-0.75,-2) 48(-0.75,2) 49(-0.25,-2) 50(-0.25,2) 51(0.25,-2) 52(0.25,2) 53(0.75,-2) 54(0.75,2) 55(1.25,-2) 56(1.25,2) 57(1.75,-2) 58(1.75,2) 59(2.25,-2) 60(2.25,2) 61(2.75,-2) 62(2.75,2) 63(3.25,-2) 64(3.25,2) 65(3.75,-2) 66(3.75,2) 67(4.25,-2) 68(4.25,2) 69(4.75,-2) 70(4.75,2) 71(5.25,-2) 72(5.25,2) 73(5.75,-2) 74(5.75,2) 75(6.25,-2) 76(6.25,2) 77(6.75,-2) 78(6.75,2) 79(7.25,-2) 80(7.25,2) 81(7.75,-2) 82(7.75,2) 83(8.25,-2) 84(8.25,2) 85(8.75,-2) 86(8.75,2) 87(9.25,-2) 88(9.25,2) 89(9.75,-2) 90(9.75,2) 91(10.25,-2) 92(10.25,2) 93(10.75,-2) 94(10.75,2) 95(11.25,-2) 96(11.25,2) 97(11.75,-2) 98(11.75,2)
Top Overlay:
  drawing of 327 lines, arcs and shapes, not listed
Mechanical 8:
  drawing of 604 lines, arcs and shapes, not listed
Mechanical 14:
  drawing of 338 lines, arcs and shapes, not listed
Mechanical 15:
  lines w0.05: -14.35,-3.25 14.35,-3.25 14.35,3.25 -14.35,3.25 -14.35,-3.25
3D body "PANASONIC_AXK6S00647YG.stp": height 5.3, standoff 0, extent -14.1,-2.5 14.1,2.5